# Altium footprint library Lapwing.PcbLib: 81 footprints (part 4 of 6)
Each footprint in its own frame and in the unit in brackets; x right, y up, seen from the top. Pads: shape width x height; smd on the part's side, far side on the other; paste and mask are expansions set on the pad; w line width, h text height; cw(c..) or ccw(c..) is an arc to the next point about the centre after c.
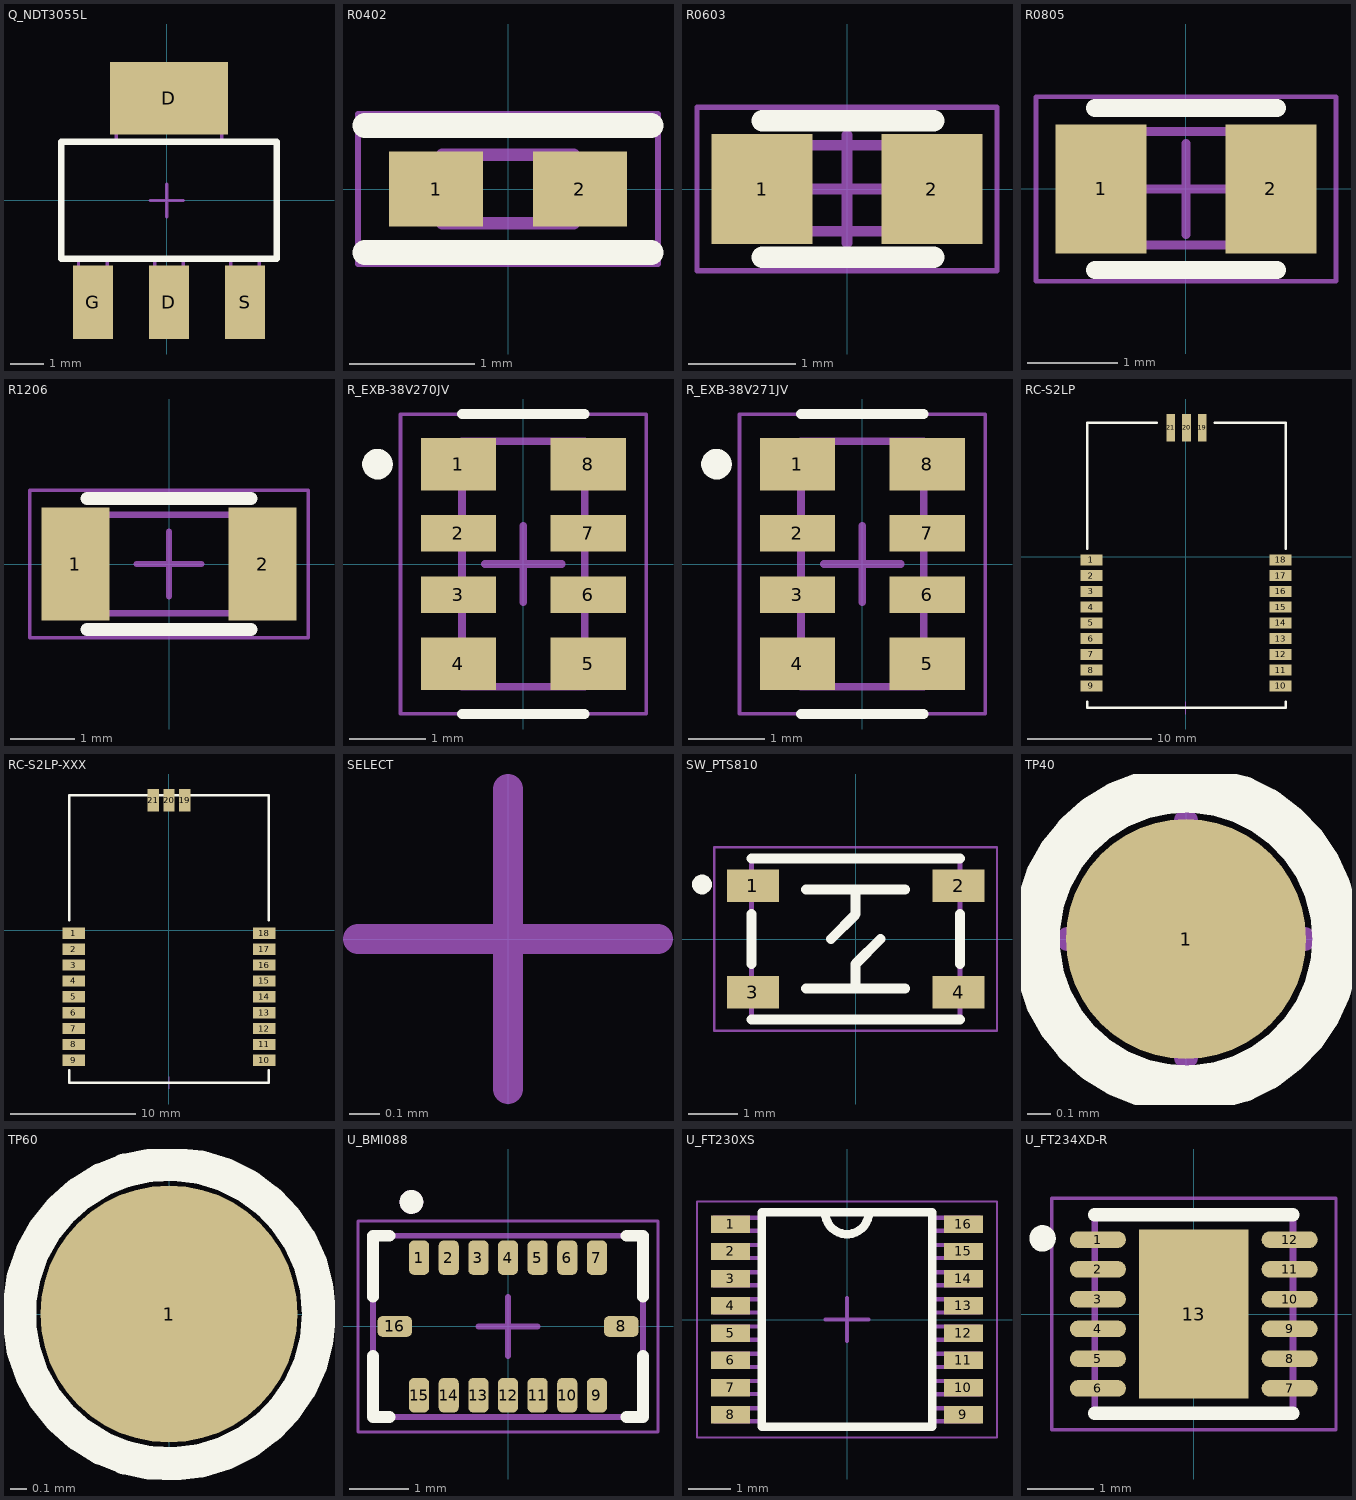
[diagram p3: the footprints below, top view; thin cyan lines are the x and y axes]

## Q_NDT3055L [mil]
pads (4):
  rect 48x88 smd: D(2.8,-121.7) G(-88.2,-121.7) S(93.8,-121.7)
  rect 141.73x86.61 smd: D(2.8,122.31)
Top Overlay:
  lines w7.87: -126.2,-69.7 -126.2,70.3 131.8,70.3 131.8,-69.7 -126.2,-69.7
Mechanical 13:
  lines w3.94: -126.2,-69.7 -126.2,70.3 -60.3,70.3 -60.3,144.3 65.8,144.3 65.8,70.3 131.8,70.3 131.8,-69.7 110.8,-69.7 110.8,-143.75 76.83,-143.75 76.83,-69.7 19.8,-69.7 19.8,-143.81 -14.21,-143.81 -14.21,-69.7 -71.2,-69.7 -71.2,-143.98 -105.41,-143.98 -105.41,-69.7 -126.2,-69.7
Mechanical 15:
  lines w3.94: -19.68,0 19.68,0 ; 0,-19.68 0,19.68
3D body "LM1117-3.3--3DModel-STEP-56544.STEP": height 70.87, standoff 0, extent -127.95,-137.74 127.96,137.76

## R0402 [mm] "Chip Resistor, 2-Leads, Body 1.0x0.5mm, IPC Medium Density"
height 0.4
pads (2):
  rect 0.75x0.6 smd: 1(-0.575,0) 2(0.575,0)
Top Overlay:
  lines w0.2: -1.143,-0.508 1.143,-0.508 ; -1.143,0.508 1.143,0.508
Mechanical 13:
  lines w0.1: -0.525,-0.275 0.525,-0.275 0.525,0.275 -0.525,0.275 -0.525,-0.275
Mechanical 15:
  lines w0.05: -1.2,-0.6 1.2,-0.6 1.2,0.6 -1.2,0.6 -1.2,-0.6
3D body "0402 resistor.STEP": height 0.35, standoff 0, extent -0.5,-0.25 0.5,0.25

## R0603 [mm] "RES 0603"
pads (2):
  rect 0.94x1.02 smd: 1(-0.79,0) 2(0.79,0)
Top Overlay:
  lines w0.2: -0.79,-0.635 0.81,-0.635 ; -0.79,0.635 0.81,0.635
Mechanical 13:
  lines w0.1: -0.813,-0.393 0.813,-0.393 0.813,0.406 -0.813,0.406 -0.813,-0.393
Mechanical 15:
  lines w0.05: -1.397,-0.762 1.397,-0.762 1.397,0.762 -1.397,0.762 -1.397,-0.762
  lines w0.1: -0.5,0 0.5,0 ; 0,-0.5 0,0.5
3D body "RES0603.STEP": height 0.45, standoff 0, extent -0.8,-0.394 0.8,0.406

## R0805 [mm] "RES 0805"
pads (2):
  rect 1x1.42 smd: 1(-0.935,0) 2(0.935,0)
Top Overlay:
  lines w0.2: -1,-0.89 1,-0.89 ; -1,0.89 1,0.89
Mechanical 13:
  lines w0.1: -1,-0.615 -1,0.635 1,0.635 1,-0.615 -1,-0.615
Mechanical 15:
  lines w0.05: -1.651,-1.016 -1.651,1.016 1.651,1.016 1.651,-1.016 -1.651,-1.016
  lines w0.1: -0.5,0 0.5,0 ; 0,-0.5 0,0.5
3D body "RES0805.STEP": height 0.6, standoff 0, extent -1,-0.615 1,0.635

## R1206 [mm] "RES 1206"
pads (2):
  rect 1.05x1.75 smd: 1(-1.45,0) 2(1.45,0)
Top Overlay:
  lines w0.2: -1.27,-1.016 1.27,-1.016 ; -1.27,1.016 1.27,1.016
Mechanical 13:
  lines w0.1: -1.6,-0.762 1.6,-0.762 1.6,0.762 -1.6,0.762 -1.6,-0.762
Mechanical 15:
  lines w0.05: -2.159,-1.143 2.159,-1.143 2.159,1.143 -2.159,1.143 -2.159,-1.143
  lines w0.1: -0.5,0 0.5,0 ; 0,-0.5 0,0.5
3D body "RES1206.STEP": height 0.6, standoff 0, extent -1.6,-0.812 1.6,0.788

## R_EXB-38V270JV [mm]
pads (8):
  rect 0.98x0.68 smd: 1(-0.845,1.3) 4(-0.845,-1.3) 5(0.845,-1.3) 8(0.845,1.3)
  rect 0.98x0.48 smd: 2(-0.845,0.4) 3(-0.845,-0.4) 6(0.845,-0.4) 7(0.845,0.4)
Top Overlay:
  circle w0.2: c-1.9,1.3 r0.1
  lines w0.127: -0.8,-1.954 0.8,-1.954 ; -0.8,1.954 0.8,1.954
Mechanical 13:
  lines w0.1: -0.8,-1.6 -0.8,1.6 0.8,1.6 0.8,-1.6 -0.8,-1.6
Mechanical 15:
  lines w0.05: -1.6,-1.95 1.6,-1.95 1.6,1.95 -1.6,1.95 -1.6,-1.95
  lines w0.1: -0.5,0 0.5,0 ; 0,-0.5 0,0.5
3D body "EXB-38V330JV--3DModel-STEP-56544.STEP": height 0.6, standoff 0, extent -0.8,-1.6 0.8,1.6

## R_EXB-38V271JV [mm]
pads (8):
  rect 0.98x0.68 smd: 1(-0.845,1.3) 4(-0.845,-1.3) 5(0.845,-1.3) 8(0.845,1.3)
  rect 0.98x0.48 smd: 2(-0.845,0.4) 3(-0.845,-0.4) 6(0.845,-0.4) 7(0.845,0.4)
Top Overlay:
  circle w0.2: c-1.9,1.3 r0.1
  lines w0.127: -0.8,-1.954 0.8,-1.954 ; -0.8,1.954 0.8,1.954
Mechanical 13:
  lines w0.1: -0.8,-1.6 0.8,-1.6 0.8,1.6 -0.8,1.6 -0.8,-1.6
Mechanical 15:
  lines w0.05: -1.6,-1.95 1.6,-1.95 1.6,1.95 -1.6,1.95 -1.6,-1.95
  lines w0.1: -0.5,0 0.5,0 ; 0,-0.5 0,0.5
3D body "EXB-38V330JV--3DModel-STEP-56544.STEP": height 0.6, standoff 0, extent -0.8,-1.6 0.8,1.6

## RC-S2LP [mm]
pads (21):
  rect 1.8x0.9 smd: 1(-7.625,-0.25) 2(-7.625,-1.52) 3(-7.625,-2.79) 4(-7.625,-4.06) 5(-7.625,-5.33) 6(-7.625,-6.6) 7(-7.625,-7.87) 8(-7.625,-9.14) 9(-7.625,-10.41) 10(7.625,-10.41) 11(7.625,-9.14) 12(7.625,-7.87) 13(7.625,-6.6) 14(7.625,-5.33) 15(7.625,-4.06) 16(7.625,-2.79) 17(7.625,-1.52) 18(7.625,-0.25)
  rect 0.7x2.2 smd: 19(1.315,10.41) 20(0.045,10.41) 21(-1.225,10.41)
Top Overlay:
  lines w0.2: -7.955,-11.68 -7.955,-12.18 8.045,-12.18 8.045,-11.68 ; -7.955,0.63 -7.955,10.82 -2.355,10.82 ; 2.325,10.82 8.045,10.82 8.045,0.63
Mechanical 15:
  lines w0.1: -0.5,-12.18 0.5,-12.18 ; 0,-12.68 0,-11.68

## RC-S2LP-XXX [mm] "RF Module"
pads (21):
  rect 1.8x0.9 smd: 1(-7.625,-0.24) 2(-7.625,-1.51) 3(-7.625,-2.78) 4(-7.625,-4.05) 5(-7.625,-5.32) 6(-7.625,-6.59) 7(-7.625,-7.86) 8(-7.625,-9.13) 9(-7.625,-10.4) 10(7.625,-10.4) 11(7.625,-9.13) 12(7.625,-7.86) 13(7.625,-6.59) 14(7.625,-5.32) 15(7.625,-4.05) 16(7.625,-2.78) 17(7.625,-1.51) 18(7.625,-0.24)
  rect 0.9x1.8 smd: 19(1.27,10.4) 20(0,10.4) 21(-1.27,10.4)
Top Overlay:
  lines w0.2: -8,-11.2 -8,-12.2 8,-12.2 8,-11.2 ; -8,0.8 -8,10.8 8,10.8 8,0.8
Mechanical 15:
  lines w0.1: -0.5,-12.2 0.5,-12.2 ; 0,-12.7 0,-11.7

## SELECT [mm] "No Footprint Selected"
Mechanical 15:
  lines w0.1: -0.5,0 0.5,0 ; 0,-0.5 0,0.5

## SW_PTS810 [mm] "SWITCH"
pads (4):
  rect 1.05x0.65 smd: 1(-2.075,1.075) 2(2.075,1.075) 3(-2.075,-1.075) 4(2.075,-1.075)
Top Overlay:
  circle w0.2: c-3.1,1.1 r0.1
  lines w0.2: -2.1,-1.62 2.1,-1.62 ; -2.1,-0.5 -2.1,0.5 ; -2.1,1.62 2.1,1.62 ; -1,-1 1,-1 ; -1,1 1,1 ; -0.5,0 0,0.5 0,1 ; 0,-1 0,-0.5 0.5,0 ; 2.1,-0.5 2.1,0.5
Mechanical 13:
  lines w0.1: -2.1,-1.6 -2.1,1.6 2.1,1.6 2.1,-1.6 -2.1,-1.6
Mechanical 15:
  lines w0.05: -2.85,-1.85 2.85,-1.85 2.85,1.85 -2.85,1.85 -2.85,-1.85
3D body "PTS810SJG250SMTRLFS.stp": height 2.6, standoff 0.1, extent -2.287,-1.6 2.288,1.6

## TP40 [mil] "Test Pad, Round 40mil"
pads (1):
  round 40 smd: 1(0,0)
Top Overlay:
  circle w7.87: c0,0 r25
Mechanical 15:
  lines w3.94: -19.68,0 19.68,0 ; 0,-19.68 0,19.68

## TP60 [mil] "Test Pad, Round 60mil"
pads (1):
  round 60 smd: 1(0,0)
Top Overlay:
  circle w7.87: c0,0 r35
Mechanical 15:
  lines w3.94: -19.68,0 19.68,0 ; 0,-19.68 0,19.68

## U_BMI088 [mm] "IC 16LGA"
pads (16):
  rrect50% 0.34x0.58 smd: 1(-1.5,1.16) 2(-1,1.16) 3(-0.5,1.16) 4(0,1.16) 5(0.5,1.16) 6(1,1.16) 7(1.5,1.16) 9(1.5,-1.16) 10(1,-1.16) 11(0.5,-1.16) 12(0,-1.16) 13(-0.5,-1.16) 14(-1,-1.16) 15(-1.5,-1.16)
  rrect50% 0.58x0.35 smd: 8(1.91,0) 16(-1.91,0)
Top Overlay:
  circle w0.2: c-1.629,2.1 r0.1
  lines w0.2: -2.28,-0.5 -2.28,-1.53 -2,-1.53 ; -2.28,0.5 -2.28,1.53 -2,1.53 ; 2,-1.53 2.28,-1.53 2.28,-0.5 ; 2,1.53 2.28,1.53 2.28,0.5
Mechanical 13:
  circle w0.2: c-1.629,2.1 r0.1
  lines w0.1: -2.28,-1.53 -2.28,1.53 2.28,1.53 2.28,-1.53 -2.28,-1.53
Mechanical 15:
  lines w0.05: -2.53,-1.78 -2.53,1.78 2.53,1.78 2.53,-1.78 -2.53,-1.78
  lines w0.1: -0.5,0 0.5,0 ; 0,-0.5 0,0.5
3D body "BMI088--3DModel-STEP-56544.STEP": height 1, standoff 0, extent -2.25,-1.5 2.25,1.5

## U_FT230XS [mil] "IC 16-SSOP"
pads (16):
  rect 36x16 smd: 1(-107,87.5) 2(-107,62.5) 3(-107,37.5) 4(-107,12.5) 5(-107,-12.5) 6(-107,-37.5) 7(-107,-62.5) 8(-107,-87.5) 9(107,-87.5) 10(107,-62.5) 11(107,-37.5) 12(107,-12.5) 13(107,12.5) 14(107,37.5) 15(107,62.5) 16(107,87.5)
Top Overlay:
  lines w7.87: -20,98.4 ccw(c0,98.4) 20,98.4 ; -78.4,-98.4 -78.4,98.4 78.4,98.4 78.4,-98.4 -78.4,-98.4
Mechanical 13:
  lines w3.94: -122.23,6.51 -122.23,18.5 -78.5,18.5 -78.5,31.54 -122.17,31.54 -122.17,43.5 -78.5,43.5 -78.5,56.53 -122.07,56.53 -122.07,68.5 -78.5,68.5 -78.5,81.57 -122.11,81.57 -122.11,93.5 -78.5,93.5 -78.5,98.4 78.59,98.4 78.59,93.5 122,93.5 122,81.59 78.58,81.59 78.58,68.5 122,68.5 122,56.56 78.59,56.56 78.59,43.5 122,43.5 122,31.54 78.53,31.54 78.53,18.5 122,18.5 122,6.5 78.62,6.5 78.62,-6.5 122,-6.5 122,-18.53 78.6,-18.53 78.6,-31.5 122,-31.5 122,-43.56 78.61,-43.56 78.61,-56.5 122,-56.5 122,-68.6 78.53,-68.6 78.53,-81.5 122,-81.5 122,-93.53 78.74,-93.53 78.74,-98.43 -78.5,-98.43 -78.5,-93.56 -122.08,-93.56 -122.08,-81.5 -78.5,-81.5 -78.5,-68.52 -122.03,-68.52 -122.03,-56.5 -78.5,-56.5 -78.5,-43.55 -122.13,-43.55 -122.13,-31.5 -78.5,-31.5 -78.5,-18.53 -122.18,-18.53 -122.18,-6.5 -78.5,-6.5 -78.5,6.51 -122.23,6.51
Mechanical 15:
  lines w1.97: -137.8,-108.27 -137.8,108.27 137.8,108.27 137.8,-108.27 -137.8,-108.27
  lines w3.94: -19.68,0 19.68,0 ; 0,-19.68 0,19.68
3D body "FT230XS-U.stp": height 69.02, standoff 0, extent -118,-96.5 118.01,96.51

## U_FT234XD-R [mm] "IC 12DFN"
pads (13):
  oval 0.85x0.25 smd: 1(-1.45,1.125) 2(-1.45,0.675) 3(-1.45,0.225) 4(-1.45,-0.225) 5(-1.45,-0.675) 6(-1.45,-1.125) 7(1.45,-1.125) 8(1.45,-0.675) 9(1.45,-0.225) 10(1.45,0.225) 11(1.45,0.675) 12(1.45,1.125)
  rect 1.65x2.55 smd: 13(0,0)
Top Overlay:
  circle w0.2: c-2.286,1.143 r0.1
  lines w0.2: -1.5,-1.5 1.5,-1.5 ; -1.5,1.5 1.5,1.5
Top Paste:
  region: -0.461,0.91 0.46,0.91 0.46,-0.912 -0.461,-0.912
Mechanical 13:
  lines w0.1: -1.5,-1.5 1.5,-1.5 1.5,1.5 -1.5,1.5 -1.5,-1.5
Mechanical 15:
  lines w0.05: -2.15,-1.75 2.15,-1.75 2.15,1.75 -2.15,1.75 -2.15,-1.75
  lines w0.1: -0.5,0 0.5,0 ; 0,-0.5 0,0.5
3D body "FT234XD-R--3DModel-STEP-56544.STEP": height 0.8, standoff 0, extent -1.5,-1.5 1.5,1.5